# Altium footprint library 3.22-杂项.PcbLib: 985 footprints (part 44 of 64)
Each footprint in its own frame and in the unit in brackets; x right, y up, seen from the top. Pads: shape width x height; smd on the part's side, far side on the other; paste and mask are expansions set on the pad; w line width, h text height; cw(c..) or ccw(c..) is an arc to the next point about the centre after c.
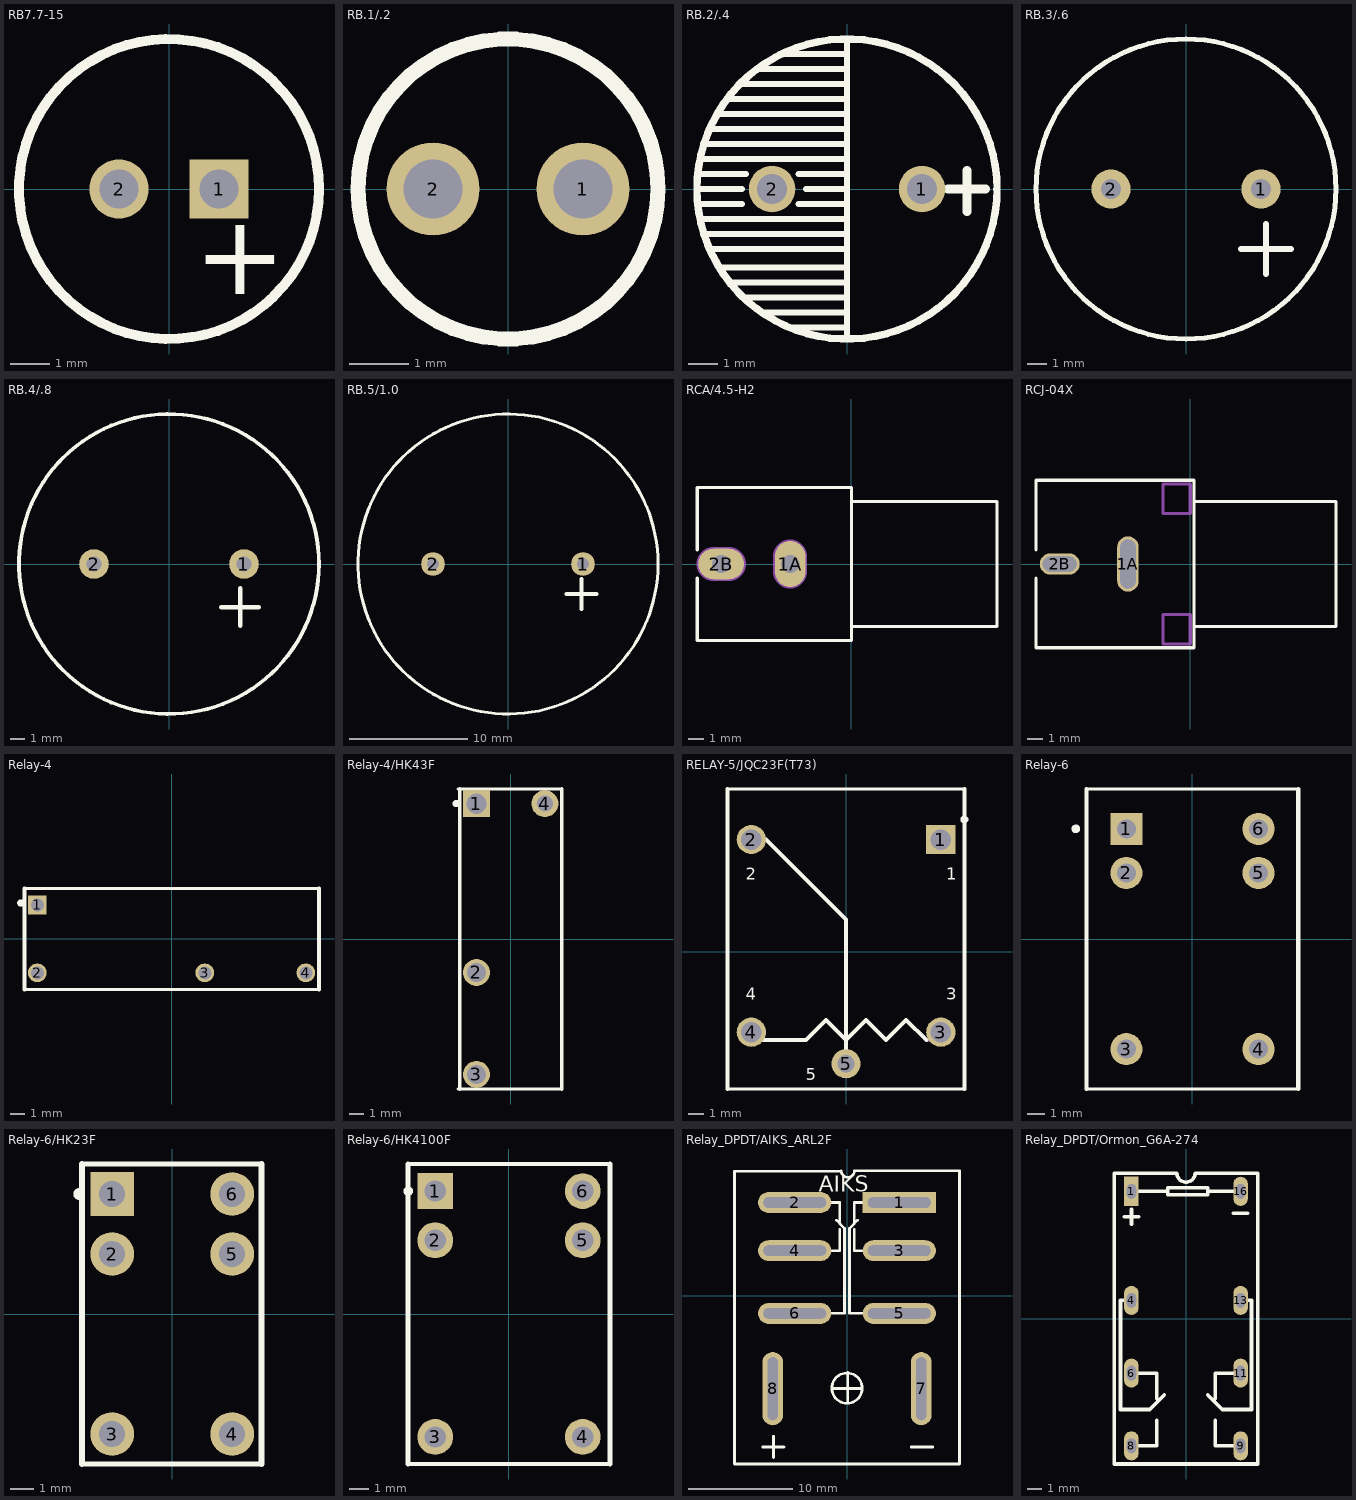
[diagram p43: the footprints below, top view; thin cyan lines are the x and y axes]

## RB7.7-15 [mm]
pads (2):
  rect 1.5x1.5 hole 1: 1(1.27,0)
  round 1.5 hole 1: 2(-1.27,0)
Top Overlay:
  circle w0.254: c0,0 r3.81
  text "+" at 0.635,-2.667 h2.03

## RB.1/.2 [mil] "铝电解，间距100mil，外围200mil，1.27/2.54mm"
pads (2):
  round 62 hole 39.37: 1(50,0) 2(-50,0)
Top Overlay:
  circle w10: c0,0 r100

## RB.2/.4 [mil] "220uF/50V,铝电解，间距200mil，外围400mil，2.54/5.08mm"
pads (2):
  round 62 hole 39.37: 1(100,0) 2(-100,0)
Top Overlay:
  circle w10: c0,0 r200
  lines w8: -200,-20 -140,-20 ; -200,0 -140,0 ; -200,20 -135,20 ; -195,-40 0,-40 ; -195,40 0,40 ; -190,-60 0,-60 ; -190,60 0,60 ; -185,-80 0,-80 ; -185,80 0,80 ; -170,-105 -5,-105 ; -170,100 -5,100 ; -160,120 -5,120 ; -155,-125 -5,-125 ; -140,-145 -5,-145 ; -140,140 -5,140 ; -120,160 -5,160 ; -115,-165 -5,-165 ; -90,180 -5,180 ; -75,-185 -5,-185 ; -65,-20 0,-20 ; -65,20 0,20 ; -55,0 0,0 ; 0,-200 0,200
  lines w12: 135,0 185,0 ; 160,-30 160,25

## RB.3/.6 [mm] "铝电解，间距300mil，外围600mil，7.62/15.24mm"
pads (2):
  round 2 hole 1: 1(3.81,0) 2(-3.81,0)
Top Overlay:
  circle w0.254: c0,0 r7.62
  lines w0.305: 2.794,-3.048 5.334,-3.048 ; 4.064,-4.318 4.064,-1.778

## RB.4/.8 [mm] "铝电解，间距400mil，外围800mil，10.16/20.32mm"
pads (2):
  round 2 hole 1: 1(5.08,0) 2(-5.08,0)
Top Overlay:
  circle w0.254: c0,0 r10.16
  lines w0.305: 3.556,-2.921 6.096,-2.921 ; 4.826,-4.191 4.826,-1.651

## RB.5/1.0 [mm] "铝电解，间距500mil，外围1000mil，12.7/24.14mm"
pads (2):
  round 2 hole 1: 1(6.35,0) 2(-6.35,0)
Top Overlay:
  circle w0.254: c0,0 r12.7
  lines w0.305: 4.953,-2.54 7.493,-2.54 ; 6.223,-3.81 6.223,-1.27

## RCA/4.5-H2 [mm] "Two Conductor Jack (RCA)"
height 13
pads (2):
  oval 2x3 hole 1.2: 1A(-4,0)
  oval 3x2 hole 1.2: 2B(-8.496,0)
Top Overlay:
  lines w0.2: -10.075,5 -0.018,5 ; -10.057,-0.92 -10.057,-5 0,-5 0,5 ; -10.057,0.92 -10.057,5 ; 0,-4.065 9.5,-4.065 9.5,4.065 0,4.065
Mechanical 1:
  lines w1.2: -8.996,0 -7.996,0 ; -4,-0.5 -4,0.5
Mechanical 2:
  lines w2.216: -8.996,0 -7.996,0 ; -4,-0.5 -4,0.5

## RCJ-04X [mm] "Two Conductor Jack (RCA)"
height 13
pads (2):
  oval 1.4x3.6 hole 1 slot 3.2 at 90 deg: 1A(-4.064,0)
  oval 2.6x1.4 hole 1 slot 2.2 at 0 deg: 2B(-8.509,0)
Top Overlay:
  lines w0.2: -10.057,-0.92 -10.057,-5.461 0.254,-5.461 0.254,5.461 -10.057,5.461 -10.057,0.92 ; 0.254,-4.065 9.5,-4.065 9.5,4.065 0.254,4.065
Mechanical 1:
  lines w0.2: -1.778,-5.207 0,-5.207 0,-3.302 -1.778,-3.302 -1.778,-5.207 ; -1.778,3.302 -1.778,5.207 0,5.207 0,3.302 -1.778,3.302

## Relay-4 [mm] "HK43F继电器（4脚）"
pads (4):
  rect 1.3x1.3 hole 0.9: 1(-9.3,2.35)
  round 1.3 hole 0.9: 2(-9.3,-2.35) 3(2.3,-2.35) 4(9.3,-2.35)
Top Overlay:
  circle w0.25: c-10.441,2.477 r0.125
  lines w0.2: -10.189,-3.507 10.211,-3.507 ; -10.189,3.493 10.211,3.493
  lines w0.254: -10.189,-3.507 -10.189,3.493 ; 10.211,-3.507 10.211,3.493

## Relay-4/HK43F [mm] "汇科HK43F继电器20.4*7*15"
height 15
pads (4):
  rect 1.85x1.85 hole 1.4: 1(-2.35,9.3)
  round 1.85 hole 1.3: 2(-2.35,-2.3) 3(-2.35,-9.3)
  round 1.85 hole 1.1: 4(2.35,9.3)
Top Overlay:
  circle w0.25: c-3.745,9.3 r0.125
  lines w0.2: -3.62,-10.3 3.5,-10.3 ; -3.62,10.3 3.5,10.3
  lines w0.254: -3.5,-10.3 -3.5,10.3 ; 3.5,-10.3 3.5,10.3

## RELAY-5/JQC23F(T73) [mm] "宁波神乐RELAY-5/JQC23F(T73)继电器（5脚）18*13.4*15.5"
pads (5):
  rect 1.85x1.85 hole 1.3: 1(6,7.1)
  round 1.85 hole 1.3: 2(-6,7.1) 3(6,-5.1) 4(-6,-5.1)
  round 1.85 hole 1.1: 5(0,-7.1)
Top Overlay:
  circle w0.25: c7.495,8.37 r0.125
  lines w0.2: -7.5,-8.7 7.5,-8.7 ; -7.5,10.3 7.5,10.3
  lines w0.254: -7.5,-8.7 -7.5,10.3 ; -6.35,-5.6 -2.54,-5.6 -1.27,-4.33 0,-5.6 1.27,-4.33 2.54,-5.6 3.81,-4.33 5.08,-5.6 ; -5.08,7.1 0,2.02 0,-6.87 ; 7.5,-8.7 7.5,10.3
  text "1" at 6.35,4.56 h0.76
  text "2" at -6.35,4.56 h0.76
  text "4" at -6.35,-3.06 h0.76
  text "3" at 6.35,-3.06 h0.76
  text "5" at -2.54,-8.14 h0.76
Keep-Out Layer:
  lines w0.254: -6.35,7.1 -5.08,7.1 ; 5.08,-5.6 6.35,-5.6

## Relay-6 [mm] "JRC-21F-05VDC继电器（6脚）"
pads (6):
  rect 1.85x1.85 hole 1.1: 1(-3.81,6.35)
  round 1.85 hole 1.1: 2(-3.81,3.81) 3(-3.81,-6.35) 4(3.81,-6.35) 5(3.81,3.81) 6(3.81,6.35)
Top Overlay:
  circle w0.25: c-6.729,6.35 r0.125
  lines w0.2: -6.11,-8.65 6.11,-8.65 ; -6.11,8.65 6.11,8.65
  lines w0.254: -6.11,-8.65 -6.11,8.65 ; 6.11,-8.65 6.11,8.65

## Relay-6/HK23F [mm] "汇科HK23F继电器（6脚）12.5*7.5*10.3"
pads (6):
  rect 1.85x1.85 hole 1.1: 1(-2.54,5.08)
  round 1.85 hole 1.1: 2(-2.54,2.54) 3(-2.54,-5.08) 4(2.54,-5.08) 5(2.54,2.54) 6(2.54,5.08)
Top Overlay:
  circle w0.25: c-3.935,5.08 r0.125
  lines w0.2: -3.81,-6.35 3.79,-6.35 ; -3.81,6.35 3.79,6.35
  lines w0.254: -3.81,-6.35 -3.81,6.35 ; 3.79,-6.35 3.79,6.35

## Relay-6/HK4100F [mm] "汇科HK4100F继电器（6脚）15.5*10.5*11.8"
pads (6):
  rect 1.85x1.85 hole 1.1: 1(-3.81,6.35)
  round 1.85 hole 1.1: 2(-3.81,3.81) 3(-3.81,-6.35) 4(3.81,-6.35) 5(3.81,3.81) 6(3.81,6.35)
Top Overlay:
  circle w0.25: c-5.205,6.35 r0.125
  lines w0.2: -5.22,-7.75 5.23,-7.75 ; -5.22,7.75 5.23,7.75
  lines w0.254: -5.22,-7.75 -5.22,7.75 ; 5.23,-7.75 5.23,7.75

## Relay_DPDT/AIKS_ARL2F [mm] "香港爱克斯AIKSDPDT继电器ARL2F_5VDC_220VAC10A/28VDC10A"
pads (8):
  rect 7x2 hole 1 slot 6 at 0 deg: 1(5,8.9)
  oval 7x2 hole 1 slot 6 at 0 deg: 2(-5,8.9) 3(5,4.3) 4(-5,4.3) 5(5,-1.7) 6(-5,-1.7)
  oval 2x7 hole 1 slot 6 at 90 deg: 7(7.1,-8.9) 8(-7.1,-8.9)
Top Overlay:
  circle w0.254: c0,-8.85 r1.448
  lines w0.254: -8.048,-14.468 -6.016,-14.468 ; -7.032,-15.484 -7.032,-13.452 ; -5,-1.7 -0.242,-1.7 -0.242,6.428 -1.027,7.213 ; -5,4.3 -0.682,4.3 -0.682,6.332 ; -5,8.9 -0.682,8.9 -0.682,6.868 ; -1.444,-8.88 1.418,-8.88 ; -0.555,11.9 -10.75,11.9 -10.75,-16.1 10.75,-16.1 10.75,11.9 ; -0.555,11.948 ccw(c0.08,11.948) 0.715,11.948 10.75,11.948 ; 0.08,-10.15 0.08,-8.88 0.08,-7.356 ; 0.682,6.332 0.682,4.3 5,4.3 ; 0.682,6.868 0.682,8.9 5,8.9 ; 1.027,7.213 0.242,6.428 0.242,-1.7 5,-1.7 ; 6.152,-14.468 8.184,-14.468
  text "AIKS" at -2.714,9.916 h1.52

## Relay_DPDT/Ormon_G6A-274 [mil] "欧姆龙DPDT继电器DIP16封装改成8脚"
pads (8):
  rect 40x80 hole 25 slot 40 at 90 deg: 1(-150,350)
  oval 40x80 hole 25 slot 40 at 90 deg: 4(-150,50) 6(-150,-150) 8(-150,-350) 9(150,-350) 11(150,-150) 13(150,50) 16(150,350)
Top Overlay:
  lines w10: -170,280 -160,280 -140,280 -130,280 ; -150,-350 -80,-350 -80,-280 ; -150,-150 -80,-150 -80,-220 ; -150,50 -180,50 -180,-250 -100,-250 -60,-210 ; -150,260 -150,300 ; -150,350 -50,350 ; -30,340 60,340 ; 60,-210 100,-250 180,-250 180,50 150,50 ; 60,350 150,350 ; 80,-280 80,-350 150,-350 ; 80,-220 80,-150 150,-150 ; 130,290 170,290 ; 60,340 -50,340 -50,360 60,360 60,340 ; -197.24,-400 -197.24,400 -25,400 ccw(c0,400) 25,400 197.24,400 197.24,-400 -197.24,-400